# Altium footprint library 5-C-THD.PcbLib: 166 footprints (part 7 of 11)
Each footprint in its own frame and in the unit in brackets; x right, y up, seen from the top. Pads: shape width x height; smd on the part's side, far side on the other; paste and mask are expansions set on the pad; w line width, h text height; cw(c..) or ccw(c..) is an arc to the next point about the centre after c.
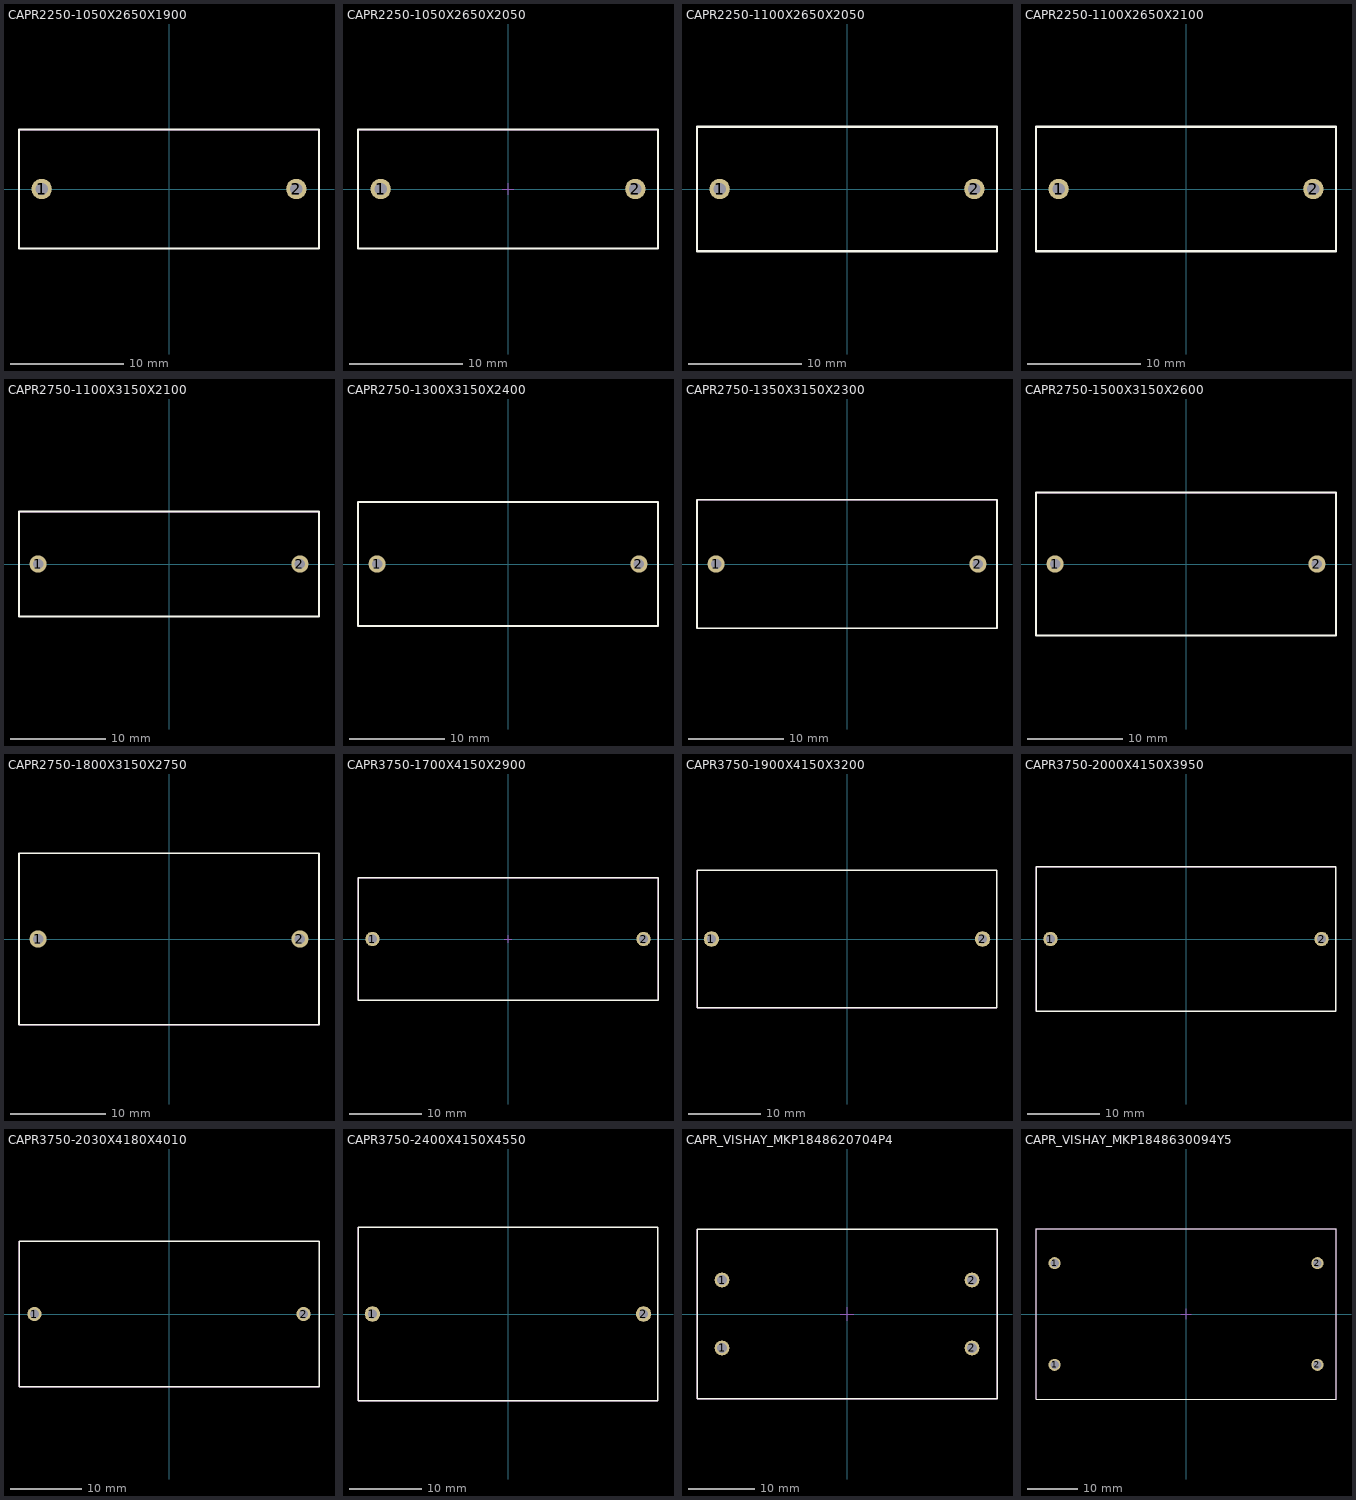
[diagram p6: the footprints below, top view; thin cyan lines are the x and y axes]

## CAPR2250-1050X2650X1900 [mm] "Capacitor Radial, Pin spacing 22.5mm - Body With 10.5mm X Body Length 26.5mm X Body Height 19mm"
height 19
pads (2):
  round 1.8 hole 1.1: 1(-11.25,0) 2(11.25,0)
Top Overlay:
  lines w0.2: -13.25,-5.25 -13.25,5.25 13.25,5.25 13.25,-5.25 -13.25,-5.25
Mechanical 13:
  lines w0.1: -13.25,-5.25 13.25,-5.25 13.25,5.25 -13.25,5.25 -13.25,-5.25
Mechanical 14:
  lines w0.1: -13.25,-5.25 -13.25,5.25 13.25,5.25 13.25,-5.25 -13.25,-5.25
3D body "CAPR2250-1050X2650X1900.stp": height 19, standoff -3.8, extent -13.249,-5.249 13.251,5.251

## CAPR2250-1050X2650X2050 [mm] "Capacitor Radial, Pin spacing 22.5mm - Body With 10.5mm X Body Length 26.5mm X Body Height 20.5mm"
height 20.5
pads (2):
  round 1.8 hole 1.1: 1(-11.25,0) 2(11.25,0)
Top Overlay:
  lines w0.2: -13.25,-5.25 13.25,-5.25 13.25,5.25 -13.25,5.25 -13.25,-5.25
Mechanical 8:
  lines w0.1: -11.75,0 -11.25,0 ; -11.25,-0.5 -11.25,0 ; -11.25,0.5 -11.25,0 ; -10.75,0 -11.25,0 ; -0.5,0 0,0 ; 0,-0.5 0,0 ; 0,0.5 0,0 ; 0.5,0 0,0 ; 10.75,0 11.25,0 ; 11.25,-0.5 11.25,0 ; 11.25,0.5 11.25,0 ; 11.75,0 11.25,0
Mechanical 14:
  lines w0.1: -13.25,-5.25 -13.25,5.25 13.25,5.25 13.25,-5.25 -13.25,-5.25
3D body "CAPR2250-1050X2650X2050.stp": height 20.5, standoff -3.8, extent -13.25,-5.25 13.25,5.25

## CAPR2250-1100X2650X2050 [mm] "Capacitor Radial, Pin spacing 22.5mm - Body With 11mm X Body Length 26.5mm X Body Height 20.5mm"
height 20.5
pads (2):
  round 1.8 hole 1.1: 1(-11.25,0) 2(11.25,0)
Top Overlay:
  lines w0.2: -13.25,-5.5 13.25,-5.5 13.25,5.5 -13.25,5.5 -13.25,-5.5
Mechanical 13:
  lines w0.1: -13.25,-5.5 -13.25,5.5 13.25,5.5 13.25,-5.5 -13.25,-5.5
Mechanical 14:
  lines w0.1: -13.25,-5.5 13.25,-5.5 13.25,5.5 -13.25,5.5 -13.25,-5.5
3D body "CAPR2250-1100X2650X2050.stp": height 20.5, standoff -3.8, extent -13.249,-5.499 13.251,5.501

## CAPR2250-1100X2650X2100 [mm] "Capacitor Radial, Pin spacing 22.5mm - Body With 11mm X Body Length 26.5mm X Body Height 21mm"
height 21
pads (2):
  round 1.8 hole 1.1: 1(-11.25,0) 2(11.25,0)
Top Overlay:
  lines w0.2: -13.25,-5.5 -13.25,5.5 13.25,5.5 13.25,-5.5 -13.25,-5.5
Mechanical 13:
  lines w0.1: -13.25,-5.5 13.25,-5.5 13.25,5.5 -13.25,5.5 -13.25,-5.5
Mechanical 14:
  lines w0.1: -13.25,-5.5 -13.25,5.5 13.25,5.5 13.25,-5.5 -13.25,-5.5
3D body "CAPR2250-1100X2650X2100.stp": height 21, standoff -3.8, extent -13.249,-5.499 13.251,5.501

## CAPR2750-1100X3150X2100 [mm] "Capacitor Radial, Pin spacing 27.5mm - Body With 11mm X Body Length 31.5mm X Body Height 21mm"
height 21
pads (2):
  round 1.8 hole 1.1: 1(-13.75,0) 2(13.75,0)
Top Overlay:
  lines w0.2: -15.75,-5.5 15.75,-5.5 15.75,5.5 -15.75,5.5 -15.75,-5.5
Mechanical 13:
  lines w0.1: -15.75,-5.5 -15.75,5.5 15.75,5.5 15.75,-5.5 -15.75,-5.5
Mechanical 14:
  lines w0.1: -15.75,-5.5 15.75,-5.5 15.75,5.5 -15.75,5.5 -15.75,-5.5
3D body "CAPR2750-1100X3150X2100.stp": height 21, standoff -3.8, extent -15.749,-5.499 15.751,5.501

## CAPR2750-1300X3150X2400 [mm] "Capacitor Radial, Pin spacing 27.5mm - Body With 13mm X Body Length 31.5mm X Body Height 24mm"
height 24
pads (2):
  round 1.8 hole 1.1: 1(-13.75,0) 2(13.75,0)
Top Overlay:
  lines w0.2: -15.75,-6.5 15.75,-6.5 15.75,6.5 -15.75,6.5 -15.75,-6.5
Mechanical 13:
  lines w0.1: -15.75,-6.5 -15.75,6.5 15.75,6.5 15.75,-6.5 -15.75,-6.5
Mechanical 14:
  lines w0.1: -15.75,-6.5 15.75,-6.5 15.75,6.5 -15.75,6.5 -15.75,-6.5
3D body "CAPR2750-1300X3150X2400.stp": height 24, standoff -3.8, extent -15.749,-6.5 15.751,6.5

## CAPR2750-1350X3150X2300 [mm] "Capacitor Radial, Pin spacing 27.5mm - Body With 13.5mm X Body Length 31.5mm X Body Height 23mm"
height 23
pads (2):
  round 1.8 hole 1.1: 1(-13.75,0) 2(13.75,0)
Top Overlay:
  lines w0.2: -15.75,-6.75 -15.75,6.75 15.75,6.75 15.75,-6.75 -15.75,-6.75
Mechanical 13:
  lines w0.1: -15.75,-6.75 15.75,-6.75 15.75,6.75 -15.75,6.75 -15.75,-6.75
Mechanical 14:
  lines w0.1: -15.75,-6.75 -15.75,6.75 15.75,6.75 15.75,-6.75 -15.75,-6.75
3D body "CAPR2750-1350X3150X2300.stp": height 23, standoff -3.8, extent -15.749,-6.749 15.751,6.751

## CAPR2750-1500X3150X2600 [mm] "Capacitor Radial, Pin spacing 27.5mm - Body With 15.0mm X Body Length 31.5mm X Body Height 26mm"
height 26
pads (2):
  round 1.8 hole 1.1: 1(-13.75,0) 2(13.75,0)
Top Overlay:
  lines w0.2: -15.75,-7.5 15.75,-7.5 15.75,7.5 -15.75,7.5 -15.75,-7.5
Mechanical 13:
  lines w0.1: -15.75,-7.5 -15.75,7.5 15.75,7.5 15.75,-7.5 -15.75,-7.5
Mechanical 14:
  lines w0.1: -15.75,-7.5 15.75,-7.5 15.75,7.5 -15.75,7.5 -15.75,-7.5
3D body "CAPR2750-1500X3150X2600.stp": height 26, standoff -3.8, extent -15.749,-7.499 15.751,7.501

## CAPR2750-1800X3150X2750 [mm] "Capacitor Radial, Pin spacing 27.5mm - Body With 18mm X Body Length 31.5mm X Body Height 27.5mm"
height 27.5
pads (2):
  round 1.8 hole 1.1: 1(-13.75,0) 2(13.75,0)
Top Overlay:
  lines w0.2: -15.75,-9 15.75,-9 15.75,9 -15.75,9 -15.75,-9
Mechanical 13:
  lines w0.1: -15.75,-9 -15.75,9 15.75,9 15.75,-9 -15.75,-9
Mechanical 14:
  lines w0.1: -15.75,-9 15.75,-9 15.75,9 -15.75,9 -15.75,-9
3D body "CAPR2750-1800X3150X2750.stp": height 27.5, standoff -3.8, extent -15.749,-8.999 15.751,9.001

## CAPR3750-1700X4150X2900 [mm] "Capacitor Radial, Pin spacing 37.5mm - Body Width 17mm X Body Length 41.5mm X Body Height 29mm"
height 29
pads (2):
  round 2 hole 1.3: 1(-18.75,0) 2(18.75,0)
Top Overlay:
  lines w0.2: -20.75,-8.5 20.75,-8.5 20.75,8.5 -20.75,8.5 -20.75,-8.5
Mechanical 8:
  lines w0.1: -19.25,0 -18.75,0 ; -18.75,-0.5 -18.75,0 ; -18.75,0.5 -18.75,0 ; -18.25,0 -18.75,0 ; -0.5,0 0,0 ; 0,-0.5 0,0 ; 0,0.5 0,0 ; 0.5,0 0,0 ; 18.25,0 18.75,0 ; 18.75,-0.5 18.75,0 ; 18.75,0.5 18.75,0 ; 19.25,0 18.75,0
Mechanical 14:
  lines w0.1: -20.75,-8.5 20.75,-8.5 20.75,8.5 -20.75,8.5 -20.75,-8.5
3D body "CAPR3750-1700X4150X2900.stp": height 29, standoff -3.8, extent -20.75,-8.5 20.75,8.5

## CAPR3750-1900X4150X3200 [mm] "Capacitor Radial, Pin spacing 37.5mm - Body With 19mm X Body Length 41.5mm X Body Height 32mm"
height 32
pads (2):
  round 2.15 hole 1.3: 1(-18.75,0) 2(18.75,0)
Top Overlay:
  lines w0.2: -20.75,-9.5 -20.75,9.5 20.75,9.5 20.75,-9.5 -20.75,-9.5
Mechanical 13:
  lines w0.1: -20.75,-9.5 20.75,-9.5 20.75,9.5 -20.75,9.5 -20.75,-9.5
Mechanical 14:
  lines w0.1: -20.75,-9.5 -20.75,9.5 20.75,9.5 20.75,-9.5 -20.75,-9.5
3D body "CAPR3750-1900X4150X3200.stp": height 32, standoff -3.8, extent -20.75,-9.5 20.75,9.5

## CAPR3750-2000X4150X3950 [mm] "Capacitor Radial, Pin spacing 37.5mm - Body Width 20mm X Body Length 41.5mm X Body Height 39.5mm"
height 39.5
pads (2):
  round 2 hole 1.3: 1(-18.75,0) 2(18.75,0)
Top Overlay:
  lines w0.2: -20.75,-10 20.75,-10 20.75,10 -20.75,10 -20.75,-10
Mechanical 13:
  lines w0.1: -20.75,-10 -20.75,10 20.75,10 20.75,-10 -20.75,-10
Mechanical 14:
  lines w0.1: -20.75,-10 20.75,-10 20.75,10 -20.75,10 -20.75,-10
3D body "CAPR3750-2000X4150X3950.stp": height 39.5, standoff -3.8, extent -20.75,-10 20.75,10

## CAPR3750-2030X4180X4010 [mm] "Capacitor Radial, Pin spacing 37.5mm - Body With 20.3mm X Body Length 41.8mm X Body Height 40.1mm"
height 40.1
pads (2):
  round 2 hole 1.3: 1(-18.75,0) 2(18.75,0)
Top Overlay:
  lines w0.2: -20.9,-10.15 20.9,-10.15 20.9,10.15 -20.9,10.15 -20.9,-10.15
Mechanical 14:
  lines w0.1: 20.9,-10.15 -20.9,-10.15 -20.9,10.15 20.9,10.15
3D body "CAPR3750-2030X4180X4010.stp": height 40.1, standoff -3.8, extent -20.9,-10.15 20.9,10.15

## CAPR3750-2400X4150X4550 [mm] "Capacitor Radial, Pin spacing 37.5mm - Body With 24mm X Body Length 41.5mm X Body Height 45.5mm"
height 45.5
pads (2):
  round 2.15 hole 1.3: 1(-18.75,0) 2(18.75,0)
Top Overlay:
  lines w0.2: -20.75,-12 -20.75,12 20.75,12 20.75,-12 -20.75,-12
Mechanical 13:
  lines w0.1: -20.75,-12 20.75,-12 20.75,12 -20.75,12 -20.75,-12
Mechanical 14:
  lines w0.1: -20.75,-12 -20.75,12 20.75,12 20.75,-12 -20.75,-12
3D body "CAPR3750-2400X4150X4550.stp": height 45.5, standoff -3.8, extent -20.75,-12 20.75,12

## CAPR_VISHAY_MKP1848620704P4 [mm] "Capacitor Radial, Pin spacing 37.5.5X10.2mm - Body With 21.5mm X Body Length 43mm X Body Height 39mm"
height 39
pads (4):
  round 2.2 hole 1.5: 1(-18.75,-5.1) 1(-18.75,5.1) 2(18.75,-5.1) 2(18.75,5.1)
Top Overlay:
  lines w0.2: -22.5,-12.75 22.5,-12.75 22.5,12.75 -22.5,12.75 -22.5,-12.75
Mechanical 8:
  lines w0.1: -19.75,-5.1 -18.75,-5.1 ; -19.75,5.1 -18.75,5.1 ; -18.75,-6.1 -18.75,-5.1 ; -18.75,-4.1 -18.75,-5.1 ; -18.75,4.1 -18.75,5.1 ; -18.75,6.1 -18.75,5.1 ; -17.75,-5.1 -18.75,-5.1 ; -17.75,5.1 -18.75,5.1 ; -1,0 0,0 ; 0,-1 0,0 ; 0,1 0,0 ; 1,0 0,0 ; 17.75,-5.1 18.75,-5.1 ; 17.75,5.1 18.75,5.1 ; 18.75,-6.1 18.75,-5.1 ; 18.75,-4.1 18.75,-5.1 ; 18.75,4.1 18.75,5.1 ; 18.75,6.1 18.75,5.1 ; 19.75,-5.1 18.75,-5.1 ; 19.75,5.1 18.75,5.1
Mechanical 14:
  lines w0.1: -22.5,-12.75 22.5,-12.75 22.5,12.75 -22.5,12.75 -22.5,-12.75
3D body "CAPR_VISHAY_MKP1848620704P4.stp": height 39, standoff -4, extent -22.5,-12.75 22.5,12.75

## CAPR_VISHAY_MKP1848630094Y5 [mm] "Capacitor Radial, Pin spacing 52.5X20.3mm - Body With 30mm X Body Length 57.5mm X Body Height 45mm"
height 45
pads (4):
  round 2.4 hole 1.7: 1(-26.25,-10.15) 1(-26.25,10.15) 2(26.25,-10.15) 2(26.25,10.15)
Top Overlay:
  lines w0.2: -29.95,-17 -29.95,17 29.95,17 29.95,-17 -29.95,-17
Mechanical 8:
  lines w0.1: -26.25,-10.15 -26.25,-11.15 -26.25,-10.15 ; -26.25,-10.15 -27.25,-10.15 -26.25,-10.15 ; -26.25,-10.15 -25.25,-10.15 -26.25,-10.15 ; -26.25,-10.15 -26.25,-9.15 -26.25,-10.15 ; -26.25,10.15 -26.25,9.15 -26.25,10.15 ; -26.25,10.15 -27.25,10.15 -26.25,10.15 ; -26.25,10.15 -25.25,10.15 -26.25,10.15 ; -26.25,10.15 -26.25,11.15 -26.25,10.15 ; 0,0 0,-1 0,0 ; 0,0 -1,0 0,0 ; 0,0 1,0 0,0 ; 0,0 0,1 0,0 ; 26.25,-10.15 26.25,-11.15 26.25,-10.15 ; 26.25,-10.15 25.25,-10.15 26.25,-10.15 ; 26.25,-10.15 27.25,-10.15 26.25,-10.15 ; 26.25,-10.15 26.25,-9.15 26.25,-10.15 ; 26.25,10.15 26.25,9.15 26.25,10.15 ; 26.25,10.15 25.25,10.15 26.25,10.15 ; 26.25,10.15 27.25,10.15 26.25,10.15 ; 26.25,10.15 26.25,11.15 26.25,10.15
Mechanical 14:
  lines w0.1: -29.95,-17 -29.95,17 29.95,17 29.95,-17 -29.95,-17
3D body "CAPR_VISHAY_MKP1848630094Y5.stp": height 45.5, standoff -4, extent -29.95,-17 29.95,17